# Altium footprint library Capacitors.PcbLib: 90 footprints (part 1 of 6)
Each footprint in its own frame and in the unit in brackets; x right, y up, seen from the top. Pads: shape width x height; smd on the part's side, far side on the other; paste and mask are expansions set on the pad; w line width, h text height; cw(c..) or ccw(c..) is an arc to the next point about the centre after c.
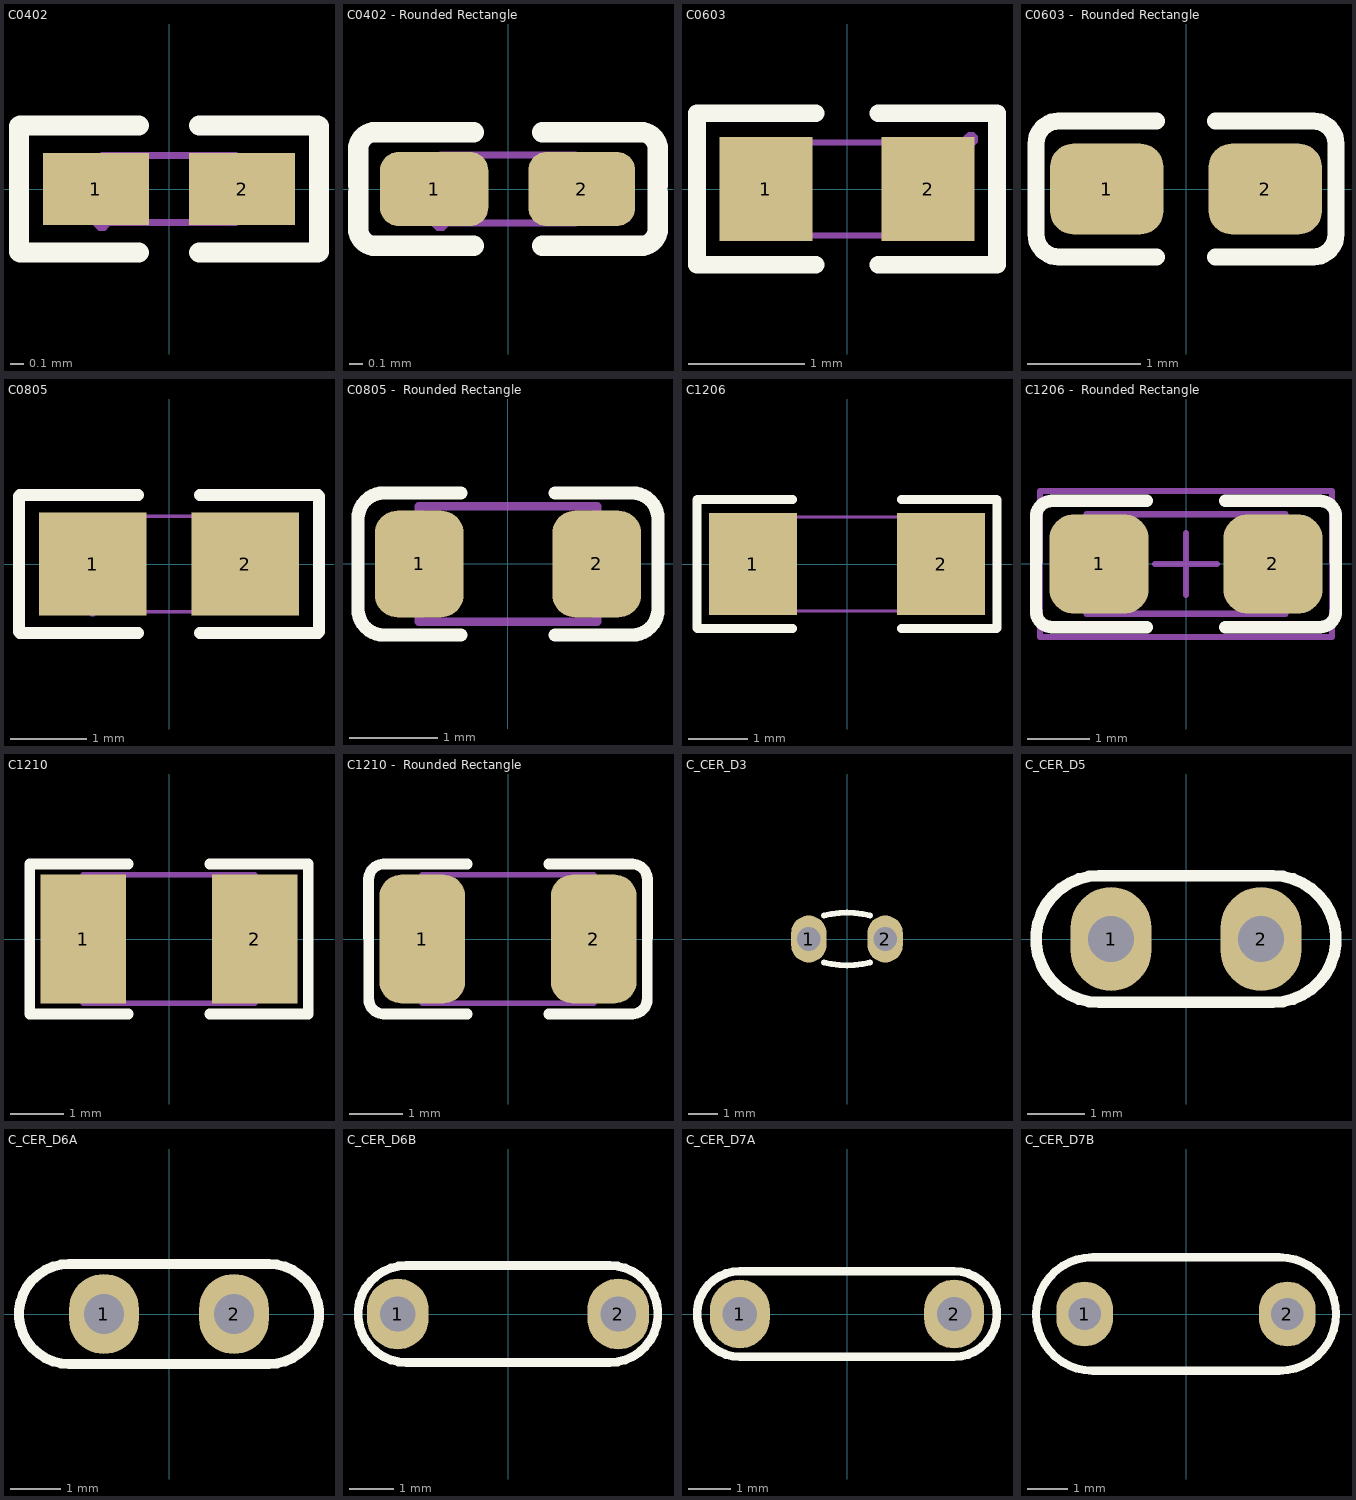
[diagram p0: the footprints below, top view; thin cyan lines are the x and y axes]

## C0402 [mm]
pads (2):
  rect 0.79x0.54 smd paste-100 mask+0.051: 1(-0.545,0) 2(0.545,0)
Top Overlay:
  lines w0.152: -1.118,-0.466 -1.118,0.346 ; -1.118,-0.346 -1.118,0.466 ; -1.107,-0.473 -0.226,-0.473 ; -1.107,0.473 -0.226,0.473 ; 0.226,-0.473 1.107,-0.473 ; 0.226,0.473 1.107,0.473 ; 1.118,-0.466 1.118,0.346 ; 1.118,-0.346 1.118,0.466
Top Paste:
  region: 0.78,0.225 0.78,-0.225 0.73,-0.275 0.25,-0.275 0.18,-0.225 0.18,0.225 0.25,0.275 0.73,0.275
  region: -0.18,0.225 -0.18,-0.225 -0.25,-0.275 -0.73,-0.275 -0.78,-0.225 -0.78,0.225 -0.73,0.275 -0.25,0.275
Mechanical 15:
  region: 0.5,-0.25 0.5,0.25 0.25,0.25 0.25,-0.25
  region: -0.5,-0.25 -0.5,0.25 -0.25,0.25 -0.25,-0.25
  region: -0.44,-0.25 -0.44,-0.225 -0.475,-0.19 -0.525,-0.19 -0.56,-0.225 -0.56,-0.25 -0.56,-0.275 -0.525,-0.31 -0.475,-0.31 -0.44,-0.275
  lines w0.051: -0.5,-0.25 0.5,-0.25 0.5,0.25 -0.5,0.25 -0.5,-0.25
3D body "CAPC-0402-T0.55-BN.stp": height 0.55, standoff 0, extent -0.525,-0.275 0.525,0.275

## C0402 - Rounded Rectangle [mm]
pads (2):
  rrect50% 0.8x0.55 smd paste-100 mask+0.051: 1(-0.545,0)
  rrect50% 0.79x0.55 smd paste-100 mask+0.051: 2(0.545,0)
Top Overlay:
  lines w0.15: -1.108,-0.295 -1.105,0.274 ; -1.108,0.295 -1.105,-0.274 ; -1.107,-0.293 ccw(c-0.98,-0.293) -0.98,-0.42 ; -1.107,0.293 cw(c-0.98,0.293) -0.98,0.42 ; 0.98,-0.42 ccw(c0.98,-0.293) 1.107,-0.293 ; 0.98,0.42 cw(c0.98,0.293) 1.107,0.293 ; 1.105,-0.274 1.108,0.295 ; 1.105,0.274 1.108,-0.295
  lines w0.152: -0.98,-0.42 -0.254,-0.42 ; -0.98,0.42 -0.254,0.42 ; 0.254,-0.42 0.98,-0.42 ; 0.254,0.42 0.98,0.42
Top Paste:
  region: 0.78,0.225 0.78,-0.225 0.73,-0.275 0.25,-0.275 0.18,-0.225 0.18,0.225 0.25,0.275 0.73,0.275
  region: -0.18,0.225 -0.18,-0.225 -0.25,-0.275 -0.73,-0.275 -0.78,-0.225 -0.78,0.225 -0.73,0.275 -0.25,0.275
Mechanical 15:
  region: 0.5,-0.25 0.5,0.25 0.25,0.25 0.25,-0.25
  region: -0.5,-0.25 -0.5,0.25 -0.25,0.25 -0.25,-0.25
  region: -0.44,-0.25 -0.44,-0.225 -0.475,-0.19 -0.525,-0.19 -0.56,-0.225 -0.56,-0.25 -0.56,-0.275 -0.525,-0.31 -0.475,-0.31 -0.44,-0.275
  lines w0.051: -0.5,-0.25 0.5,-0.25 0.5,0.25 -0.5,0.25 -0.5,-0.25
3D body "CAPC-0402-T0.55-BN.stp": height 0.55, standoff 0, extent -0.525,-0.275 0.525,0.275

## C0603 [mm]
pads (2):
  rect 0.8x0.9 smd paste+0 mask+0.051: 1(-0.7,0) 2(0.7,0)
Top Overlay:
  lines w0.152: -0.27,-0.653 -1.295,-0.653 -1.295,0.653 -0.27,0.653 ; 0.27,-0.653 1.295,-0.653 1.295,0.653 0.27,0.653
Mechanical 15:
  region: 1.13,0.43 1.13,0.455 1.095,0.49 1.045,0.49 1.01,0.455 1.01,0.43 1.01,0.405 1.045,0.37 1.095,0.37 1.13,0.405
  region: -0.8,-0.4 -0.8,0.4 -0.5,0.4 -0.5,-0.4
  region: 0.8,-0.4 0.8,0.4 0.5,0.4 0.5,-0.4
  lines w0.051: -0.8,-0.4 -0.8,0.4 0.8,0.4 0.8,-0.4 -0.8,-0.4
3D body "User Library-CAPC1608X09.step": height 0.9, standoff 0, extent -0.8,-0.4 0.8,0.4

## C0603 -  Rounded Rectangle [mm] "CHIP Capacitor, 1.6X0.8mm, 0603"
height 0.6
pads (2):
  rrect50% 1x0.8 smd mask+0.075: 1(-0.7,0) 2(0.7,0)
Top Overlay:
  lines w0.15: -1.125,-0.6 cw(c-1.125,-0.4) -1.325,-0.4 ; -1.125,0.6 ccw(c-1.125,0.4) -1.325,0.4 ; -1.117,-0.6 -0.26,-0.6 ; -1.117,0.6 -0.26,0.6 ; 0.26,-0.6 1.117,-0.6 ; 0.26,0.6 1.117,0.6 ; 1.125,-0.6 ccw(c1.125,-0.4) 1.325,-0.4 ; 1.125,0.6 cw(c1.125,0.4) 1.325,0.4 ; -1.325,-0.4 -1.325,0.4 ; -1.325,-0.4 -1.325,0.4 ; 1.325,-0.4 1.325,0.4 ; 1.325,-0.4 1.325,0.4
3D body "CAPC-0603-T0.9-BN.stp": height 0.9, standoff 0, extent -0.85,-0.45 0.85,0.45

## C0805 [mm]
pads (2):
  rect 1.41x1.35 smd paste-100 mask+0.051: 1(-1,0) 2(1,0)
Top Overlay:
  lines w0.152: -1.964,-0.889 -1.964,0.751 ; -1.964,-0.751 -1.964,0.889 -1.956,0.889 -1.956,0.904 -0.401,0.904 ; -1.956,-0.904 -0.401,-0.904 ; 0.401,-0.904 1.956,-0.904 ; 0.401,0.904 1.956,0.904 1.956,0.889 1.964,0.889 1.964,-0.751 ; 1.964,-0.889 1.964,0.751
Top Paste:
  region: 1.705,0.64 1.705,-0.64 1.655,-0.69 0.505,-0.69 0.455,-0.64 0.45,-0.23 0.9,-0.23 0.9,0.22 0.46,0.22 0.455,0.64 0.505,0.69 1.655,0.69
  region: -1.705,-0.64 -1.705,0.64 -1.655,0.69 -0.505,0.69 -0.455,0.64 -0.45,0.23 -0.9,0.23 -0.9,-0.22 -0.46,-0.22 -0.455,-0.64 -0.505,-0.69 -1.655,-0.69
Mechanical 15:
  region: 1,0.625 1,-0.625 0.5,-0.625 0.5,0.625
  region: -1,-0.625 -1,0.625 -0.5,0.625 -0.5,-0.625
  region: -0.94,-0.625 -0.941,-0.601 -0.976,-0.568 -1.024,-0.568 -1.059,-0.601 -1.06,-0.625 -1.059,-0.649 -1.024,-0.683 -0.976,-0.683 -0.941,-0.649
  lines w0.051: -1,-0.625 1,-0.625 1,0.625 -1,0.625 -1,-0.625
3D body "User Library-CAPC2013X10.step": height 1, standoff 0, extent -1,-0.625 1,0.625

## C0805 -  Rounded Rectangle [mm] "CHIP Capacitor, 2.0X1.3mm, 0805"
pads (2):
  rrect50% 1x1.2 smd mask+0.075: 1(-1,0) 2(1,0)
Top Overlay:
  lines w0.15: -1.689,-0.292 -1.689,0.508 cw(c-1.397,0.508) -1.397,0.8 -0.53,0.8 ; -1.689,0.292 -1.689,-0.508 ccw(c-1.397,-0.508) -1.397,-0.8 -0.53,-0.8 ; 0.53,-0.8 1.397,-0.8 ccw(c1.397,-0.508) 1.689,-0.508 1.689,0.292 ; 0.53,0.8 1.397,0.8 cw(c1.397,0.508) 1.689,0.508 1.689,-0.292
Mechanical 13:
  lines w0.1: -1,-0.65 1,-0.65 1,0.65 -1,0.65 -1,-0.65
3D body "CAPC-0805-T0.75-BN.stp": height 0.75, standoff 0, extent -1.05,-0.675 1.05,0.675

## C1206 [mm]
pads (2):
  rect 1.485x1.728 smd paste-100 mask+0.051: 1(-1.593,0) 2(1.593,0)
Top Overlay:
  lines w0.152: -2.54,-1.086 -2.54,0.864 ; -2.54,-0.864 -2.54,1.086 -2.533,1.093 -0.926,1.093 ; -2.533,-1.093 -0.926,-1.093 ; 0.926,-1.093 2.533,-1.093 ; 0.926,1.093 2.533,1.093 2.54,1.086 2.54,-0.864 ; 2.54,-1.086 2.54,0.864
Top Paste:
  region: 0.85,-0.764 0.85,-0.394 0.95,-0.294 1.255,-0.294 1.355,-0.194 1.355,0.194 1.255,0.294 0.95,0.294 0.85,0.394 0.85,0.764 0.95,0.864 2.235,0.864 2.335,0.764 2.335,-0.764 2.235,-0.864 0.95,-0.864
  region: -0.85,-0.764 -0.85,-0.394 -0.95,-0.294 -1.255,-0.294 -1.355,-0.194 -1.355,0.194 -1.255,0.294 -0.95,0.294 -0.85,0.394 -0.85,0.764 -0.95,0.864 -2.235,0.864 -2.335,0.764 -2.335,-0.764 -2.235,-0.864 -0.95,-0.864
Mechanical 15:
  region: -1.54,-0.8 -1.541,-0.776 -1.576,-0.742 -1.624,-0.742 -1.659,-0.776 -1.66,-0.8 -1.659,-0.824 -1.624,-0.858 -1.576,-0.858 -1.541,-0.824
  region: -1.6,-0.8 -1.6,0.8 -1.1,0.8 -1.1,-0.8
  region: 1.6,-0.8 1.6,0.8 1.1,0.8 1.1,-0.8
  lines w0.051: -1.6,-0.8 -1.6,0.8 1.6,0.8 1.6,-0.8 -1.6,-0.8
3D body "User Library-CAPC3216X10.step": height 1, standoff 0, extent -1.727,-0.8 1.473,0.8

## C1206 -  Rounded Rectangle [mm] "CHIP Capacitor, 3.2X1.6mm, 1206"
height 2
pads (2):
  rrect50% 1.6x1.6 smd mask+0.075: 1(-1.4,0) 2(1.4,0)
Top Overlay:
  lines w0.2: -2.415,-0.754 -2.413,0.762 cw(c-2.159,0.762) -2.159,1.016 -0.635,1.016 ; -2.413,-0.762 ccw(c-2.159,-0.762) -2.159,-1.016 -0.635,-1.016 ; 0.635,-1.016 2.159,-1.016 ccw(c2.159,-0.762) 2.413,-0.762 ; 0.635,1.016 2.159,1.016 cw(c2.159,0.762) 2.413,0.762 2.415,-0.754
Mechanical 13:
  lines w0.1: -1.6,-0.8 -1.6,0.8 1.6,0.8 1.6,-0.8 -1.6,-0.8
Mechanical 15:
  lines w0.1: -0.5,0 0.5,0 ; 0,-0.5 0,0.5 ; -2.35,-1.175 -2.35,1.175 2.35,1.175 2.35,-1.175 -2.35,-1.175
3D body "CAPC-1206-T1.0-BN.stp": height 1, standoff 0, extent -1.675,-0.875 1.675,0.875

## C1210 [mm] "CHIP Capacitor, 3.2X2.5mm, 1210, 3225"
pads (2):
  rect 1.6x2.4 smd mask+0.075: 1(-1.6,0) 2(1.6,0)
Top Overlay:
  lines w0.2: -0.762,-1.4 -2.6,-1.4 -2.6,0.2 -2.6,1.4 -0.762,1.4 ; 0.762,-1.4 2.6,-1.4 2.6,0.2 2.6,1.4 0.762,1.4
Mechanical 13:
  lines w0.1: -1.6,-1.2 1.6,-1.2 1.6,1.2 -1.6,1.2 -1.6,-1.2
3D body "User Library-CAPC3225X10.step": height 1, standoff 0, extent -1.6,-1.25 1.6,1.25

## C1210 -  Rounded Rectangle [mm] "CHIP Capacitor, 3.2X2.5mm, 1210, 3225"
pads (2):
  rrect50% 1.6x2.4 smd mask+0.075: 1(-1.6,0) 2(1.6,0)
Top Overlay:
  lines w0.2: -2.604,1.122 -2.599,-1.121 ; -2.6,-1.118 ccw(c-2.318,-1.118) -2.318,-1.4 -0.762,-1.4 ; -2.6,1.118 cw(c-2.318,1.118) -2.318,1.4 -0.762,1.4 ; 0.762,-1.4 2.318,-1.4 ccw(c2.318,-1.118) 2.6,-1.118 ; 0.762,1.4 2.318,1.4 cw(c2.318,1.118) 2.6,1.118 ; 2.599,-1.121 2.604,1.122
Mechanical 13:
  lines w0.1: -1.6,-1.2 -1.6,1.2 1.6,1.2 1.6,-1.2 -1.6,-1.2
3D body "CAPC-1210-T1.45-BN.stp": height 1.45, standoff 0, extent -1.75,-1.35 1.75,1.35

## C_CER_D3 [mm] "CAP, CER MULTILAYER, D:3.5mm, pitch: 2.54mm"
height 5.5
pads (2):
  oval 1.2x1.6 hole 0.8: 1(-1.3,0) 2(1.3,0)
Top Overlay:
  lines w0.2: -0.776,-0.798 ccw(c0,2.1) 0.776,-0.798 ; -0.776,0.798 cw(c0,-2.1) 0.776,0.798
3D body "User Library-Cer-Cap2 (3_5x1_5).step": height 4, standoff -2.5, extent -1.75,-0.75 1.75,0.751

## C_CER_D5 [mm] "CAP, CER, D:5mm, pitch: 2.5mm"
height 6.5
pads (2):
  oval 1.4x1.8 hole 0.8: 1(-1.3,0) 2(1.3,0)
Top Overlay:
  lines w0.2: -1.5,-1.1 cw(c-1.5,0) -1.5,1.1 1.5,1.1 cw(c1.5,0) 1.5,-1.1 -1.5,-1.1
3D body "Ceramic Capacitor 5x3_75mm.step": height 4.96, standoff -4, extent -2.458,-1 2.459,1

## C_CER_D6A [mm] "CAP, CER MULTILAYER, 5.8X1.7mm, pitch: 2.5mm"
height 6.5
pads (2):
  oval 1.4x1.6 hole 0.8 mask+0.075: 1(-1.3,0) 2(1.3,0)
Top Overlay:
  lines w0.2: -2,-1 cw(c-2,0) -2,1 2,1 cw(c2,0) 2,-1 -2,-1
3D body "Cap 100n.STEP": height 6.92, standoff -1, extent -2.915,-0.848 2.921,0.848

## C_CER_D6B [mm] "CAP, CER MULTILAYER, 6X2mm, pitch: 5mm"
height 6.5
pads (2):
  oval 1.4x1.6 hole 0.8 mask+0.075: 1(-2.5,0) 2(2.5,0)
Top Overlay:
  lines w0.2: -2.3,-1.1 cw(c-2.3,0) -2.3,1.1 2.3,1.1 cw(c2.3,0) 2.3,-1.1 -2.3,-1.1
3D body "User Library-Disc_CAP d6x3_5_5mm.step": height 8.1, standoff -2.02, extent -3,-1.05 3,1.05

## C_CER_D7A [mm] "CAP, CER MULTILAYER, 7.0X1.7mm, pitch: 5.0mm"
height 6.5
pads (2):
  oval 1.4x1.6 hole 0.8 mask+0.075: 1(-2.5,0) 2(2.5,0)
Top Overlay:
  lines w0.2: -2.5,-1 cw(c-2.5,0) -2.5,1 2.5,1 cw(c2.5,0) 2.5,-1 -2.5,-1
3D body "Cap 5mm Adasi.STEP": height 0, standoff -8.5, extent -3.495,-0.848 3.5,0.848

## C_CER_D7B [mm] "CAP, CER MULTILAYER, 7.0X2.6mm, pitch: 5.0mm"
height 6.5
pads (2):
  oval 1.4x1.6 hole 0.8 mask+0.075: 1(-2.5,0) 2(2.5,0)
Top Overlay:
  lines w0.2: -2.3,-1.4 cw(c-2.3,0) -2.3,1.4 2.3,1.4 cw(c2.3,0) 2.3,-1.4 -2.3,-1.4
3D body "User Library-CAPML200 (2_5x6_6).step": height 9.64, standoff -3.27, extent -3.538,-1.3 3.538,1.3